# Altium footprint library con-samtec.PCBLIB: 805 footprints (part 33 of 55)
Each footprint in its own frame and in the unit in brackets; x right, y up, seen from the top. Pads: shape width x height; smd on the part's side, far side on the other; paste and mask are expansions set on the pad; w line width, h text height; cw(c..) or ccw(c..) is an arc to the next point about the centre after c.
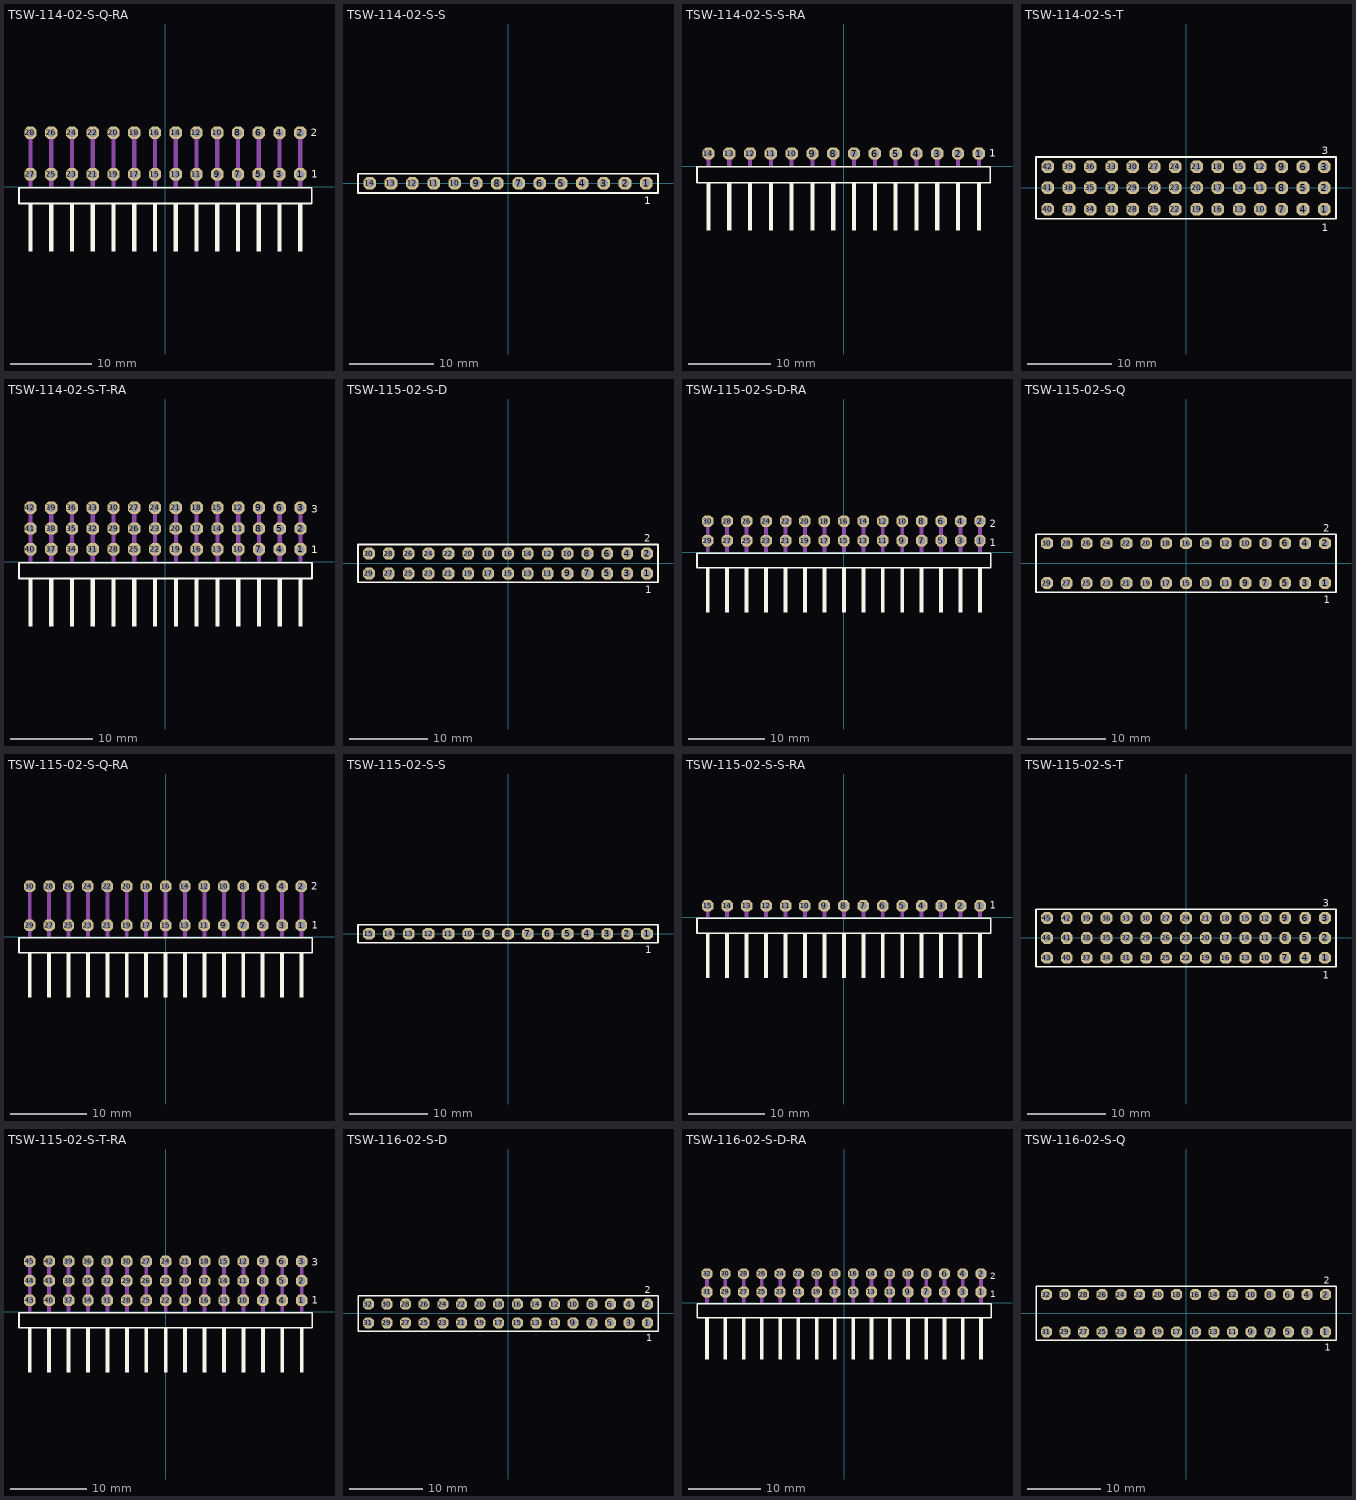
[diagram p32: the footprints below, top view; thin cyan lines are the x and y axes]

## TSW-114-02-S-Q-RA [mil]
pads (28):
  oct 59.06x59.06 hole 39.37: 1(650,60) 2(650,260) 3(550,60) 4(550,260) 5(450,60) 6(450,260) 7(350,60) 8(350,260) 9(250,60) 10(250,260) 11(150,60) 12(150,260) 13(50,60) 14(50,260) 15(-50,60) 16(-50,260) 17(-150,60) 18(-150,260) 19(-250,60) 20(-250,260) 21(-350,60) 22(-350,260) 23(-450,60) 24(-450,260) 25(-550,60) 26(-550,260) 27(-650,60) 28(-650,260)
Top Overlay:
  rectangle: -660,-310.63 -640,-80.32
  rectangle: -560,-310.63 -540,-80.32
  rectangle: -460,-310.63 -440,-80.32
  rectangle: -360,-310.63 -340,-80.32
  rectangle: -260,-310.63 -240,-80.32
  rectangle: -160,-310.63 -140,-80.32
  rectangle: -60,-310.63 -40,-80.32
  rectangle: 40,-310.63 60,-80.32
  rectangle: 140,-310.63 160,-80.32
  rectangle: 240,-310.63 260,-80.32
  rectangle: 340,-310.63 360,-80.32
  rectangle: 440,-310.63 460,-80.32
  rectangle: 540,-310.63 560,-80.32
  rectangle: 640,-310.63 660,-80.32
  lines w8: -705.08,-80.55 705.08,-80.55 705.08,-4.17 -705.08,-4.17 -705.08,-80.55
  text "1" at 703.54,43.31 h36.81
  text "2" at 701.18,242.72 h36.81
Mechanical 16:
  rectangle: -660,0 -640,270
  rectangle: -560,0 -540,270
  rectangle: -460,0 -440,270
  rectangle: -360,0 -340,270
  rectangle: -260,0 -240,270
  rectangle: -160,0 -140,270
  rectangle: -60,0 -40,270
  rectangle: 40,0 60,270
  rectangle: 140,0 160,270
  rectangle: 240,0 260,270
  rectangle: 340,0 360,270
  rectangle: 440,0 460,270
  rectangle: 540,0 560,270
  rectangle: 640,0 660,270

## TSW-114-02-S-S [mm]
pads (14):
  oct 1.5x1.5 hole 1: 1(16.51,0) 2(13.97,0) 3(11.43,0) 4(8.89,0) 5(6.35,0) 6(3.81,0) 7(1.27,0) 8(-1.27,0) 9(-3.81,0) 10(-6.35,0) 11(-8.89,0) 12(-11.43,0) 13(-13.97,0) 14(-16.51,0)
Top Overlay:
  lines w0.203: -17.909,-1.155 17.909,-1.155 17.909,1.155 -17.909,1.155 -17.909,-1.155
  text "1" at 16.252,-2.498 h0.94
Mechanical 16:
  rectangle: -16.86,-0.35 -16.16,0.35
  rectangle: -14.32,-0.35 -13.62,0.35
  rectangle: -11.78,-0.35 -11.08,0.35
  rectangle: -9.24,-0.35 -8.54,0.35
  rectangle: -6.7,-0.35 -6,0.35
  rectangle: -4.16,-0.35 -3.46,0.35
  rectangle: -1.62,-0.35 -0.92,0.35
  rectangle: 0.92,-0.35 1.62,0.35
  rectangle: 3.46,-0.35 4.16,0.35
  rectangle: 6,-0.35 6.7,0.35
  rectangle: 8.54,-0.35 9.24,0.35
  rectangle: 11.08,-0.35 11.78,0.35
  rectangle: 13.62,-0.35 14.32,0.35
  rectangle: 16.16,-0.35 16.86,0.35

## TSW-114-02-S-S-RA [mil]
pads (14):
  oct 59.06x59.06 hole 39.37: 1(650,60) 2(550,60) 3(450,60) 4(350,60) 5(250,60) 6(150,60) 7(50,60) 8(-50,60) 9(-150,60) 10(-250,60) 11(-350,60) 12(-450,60) 13(-550,60) 14(-650,60)
Top Overlay:
  rectangle: -660,-310.63 -640,-80.32
  rectangle: -560,-310.63 -540,-80.32
  rectangle: -460,-310.63 -440,-80.32
  rectangle: -360,-310.63 -340,-80.32
  rectangle: -260,-310.63 -240,-80.32
  rectangle: -160,-310.63 -140,-80.32
  rectangle: -60,-310.63 -40,-80.32
  rectangle: 40,-310.63 60,-80.32
  rectangle: 140,-310.63 160,-80.32
  rectangle: 240,-310.63 260,-80.32
  rectangle: 340,-310.63 360,-80.32
  rectangle: 440,-310.63 460,-80.32
  rectangle: 540,-310.63 560,-80.32
  rectangle: 640,-310.63 660,-80.32
  lines w8: -705.08,-80.55 705.08,-80.55 705.08,-4.17 -705.08,-4.17 -705.08,-80.55
  text "1" at 700.47,45.35 h36.81
Mechanical 16:
  rectangle: -660,0 -640,70
  rectangle: -560,0 -540,70
  rectangle: -460,0 -440,70
  rectangle: -360,0 -340,70
  rectangle: -260,0 -240,70
  rectangle: -160,0 -140,70
  rectangle: -60,0 -40,70
  rectangle: 40,0 60,70
  rectangle: 140,0 160,70
  rectangle: 240,0 260,70
  rectangle: 340,0 360,70
  rectangle: 440,0 460,70
  rectangle: 540,0 560,70
  rectangle: 640,0 660,70

## TSW-114-02-S-T [mm]
pads (42):
  oct 1.5x1.5 hole 1: 1(16.51,-2.54) 2(16.51,0) 3(16.51,2.54) 4(13.97,-2.54) 5(13.97,0) 6(13.97,2.54) 7(11.43,-2.54) 8(11.43,0) 9(11.43,2.54) 10(8.89,-2.54) 11(8.89,0) 12(8.89,2.54) 13(6.35,-2.54) 14(6.35,0) 15(6.35,2.54) 16(3.81,-2.54) 17(3.81,0) 18(3.81,2.54) 19(1.27,-2.54) 20(1.27,0) 21(1.27,2.54) 22(-1.27,-2.54) 23(-1.27,0) 24(-1.27,2.54) 25(-3.81,-2.54) 26(-3.81,0) 27(-3.81,2.54) 28(-6.35,-2.54) 29(-6.35,0) 30(-6.35,2.54) 31(-8.89,-2.54) 32(-8.89,0) 33(-8.89,2.54) 34(-11.43,-2.54) 35(-11.43,0) 36(-11.43,2.54) 37(-13.97,-2.54) 38(-13.97,0) 39(-13.97,2.54) 40(-16.51,-2.54) 41(-16.51,0) 42(-16.51,2.54)
Top Overlay:
  lines w0.203: -17.909,-3.695 17.909,-3.695 17.909,3.695 -17.909,3.695 -17.909,-3.695
  text "1" at 16.202,-5.188 h0.94
  text "3" at 16.198,3.989 h0.94
Mechanical 16:
  rectangle: -16.86,-2.89 -16.16,-2.19
  rectangle: -16.86,-0.35 -16.16,0.35
  rectangle: -16.86,2.19 -16.16,2.89
  rectangle: -14.32,-2.89 -13.62,-2.19
  rectangle: -14.32,-0.35 -13.62,0.35
  rectangle: -14.32,2.19 -13.62,2.89
  rectangle: -11.78,-2.89 -11.08,-2.19
  rectangle: -11.78,-0.35 -11.08,0.35
  rectangle: -11.78,2.19 -11.08,2.89
  rectangle: -9.24,-2.89 -8.54,-2.19
  rectangle: -9.24,-0.35 -8.54,0.35
  rectangle: -9.24,2.19 -8.54,2.89
  rectangle: -6.7,-2.89 -6,-2.19
  rectangle: -6.7,-0.35 -6,0.35
  rectangle: -6.7,2.19 -6,2.89
  rectangle: -4.16,-2.89 -3.46,-2.19
  rectangle: -4.16,-0.35 -3.46,0.35
  rectangle: -4.16,2.19 -3.46,2.89
  rectangle: -1.62,-2.89 -0.92,-2.19
  rectangle: -1.62,-0.35 -0.92,0.35
  rectangle: -1.62,2.19 -0.92,2.89
  rectangle: 0.92,-2.89 1.62,-2.19
  rectangle: 0.92,-0.35 1.62,0.35
  rectangle: 0.92,2.19 1.62,2.89
  rectangle: 3.46,-2.89 4.16,-2.19
  rectangle: 3.46,-0.35 4.16,0.35
  rectangle: 3.46,2.19 4.16,2.89
  rectangle: 6,-2.89 6.7,-2.19
  rectangle: 6,-0.35 6.7,0.35
  rectangle: 6,2.19 6.7,2.89
  rectangle: 8.54,-2.89 9.24,-2.19
  rectangle: 8.54,-0.35 9.24,0.35
  rectangle: 8.54,2.19 9.24,2.89
  rectangle: 11.08,-2.89 11.78,-2.19
  rectangle: 11.08,-0.35 11.78,0.35
  rectangle: 11.08,2.19 11.78,2.89
  rectangle: 13.62,-2.89 14.32,-2.19
  rectangle: 13.62,-0.35 14.32,0.35
  rectangle: 13.62,2.19 14.32,2.89
  rectangle: 16.16,-2.89 16.86,-2.19
  rectangle: 16.16,-0.35 16.86,0.35
  rectangle: 16.16,2.19 16.86,2.89

## TSW-114-02-S-T-RA [mil]
pads (42):
  oct 59.06x59.06 hole 39.37: 1(650,60) 2(650,160) 3(650,260) 4(550,60) 5(550,160) 6(550,260) 7(450,60) 8(450,160) 9(450,260) 10(350,60) 11(350,160) 12(350,260) 13(250,60) 14(250,160) 15(250,260) 16(150,60) 17(150,160) 18(150,260) 19(50,60) 20(50,160) 21(50,260) 22(-50,60) 23(-50,160) 24(-50,260) 25(-150,60) 26(-150,160) 27(-150,260) 28(-250,60) 29(-250,160) 30(-250,260) 31(-350,60) 32(-350,160) 33(-350,260) 34(-450,60) 35(-450,160) 36(-450,260) 37(-550,60) 38(-550,160) 39(-550,260) 40(-650,60) 41(-650,160) 42(-650,260)
Top Overlay:
  rectangle: -660,-310.63 -640,-80.32
  rectangle: -560,-310.63 -540,-80.32
  rectangle: -460,-310.63 -440,-80.32
  rectangle: -360,-310.63 -340,-80.32
  rectangle: -260,-310.63 -240,-80.32
  rectangle: -160,-310.63 -140,-80.32
  rectangle: -60,-310.63 -40,-80.32
  rectangle: 40,-310.63 60,-80.32
  rectangle: 140,-310.63 160,-80.32
  rectangle: 240,-310.63 260,-80.32
  rectangle: 340,-310.63 360,-80.32
  rectangle: 440,-310.63 460,-80.32
  rectangle: 540,-310.63 560,-80.32
  rectangle: 640,-310.63 660,-80.32
  lines w8: -705.08,-80.55 705.08,-80.55 705.08,-4.17 -705.08,-4.17 -705.08,-80.55
  text "1" at 701.57,41.34 h36.81
  text "3" at 702.17,236.81 h36.81
Mechanical 16:
  rectangle: -660,0 -640,270
  rectangle: -560,0 -540,270
  rectangle: -460,0 -440,270
  rectangle: -360,0 -340,270
  rectangle: -260,0 -240,270
  rectangle: -160,0 -140,270
  rectangle: -60,0 -40,270
  rectangle: 40,0 60,270
  rectangle: 140,0 160,270
  rectangle: 240,0 260,270
  rectangle: 340,0 360,270
  rectangle: 440,0 460,270
  rectangle: 540,0 560,270
  rectangle: 640,0 660,270

## TSW-115-02-S-D [mm]
pads (30):
  oct 1.5x1.5 hole 1: 1(17.78,-1.27) 2(17.78,1.27) 3(15.24,-1.27) 4(15.24,1.27) 5(12.7,-1.27) 6(12.7,1.27) 7(10.16,-1.27) 8(10.16,1.27) 9(7.62,-1.27) 10(7.62,1.27) 11(5.08,-1.27) 12(5.08,1.27) 13(2.54,-1.27) 14(2.54,1.27) 15(0,-1.27) 16(0,1.27) 17(-2.54,-1.27) 18(-2.54,1.27) 19(-5.08,-1.27) 20(-5.08,1.27) 21(-7.62,-1.27) 22(-7.62,1.27) 23(-10.16,-1.27) 24(-10.16,1.27) 25(-12.7,-1.27) 26(-12.7,1.27) 27(-15.24,-1.27) 28(-15.24,1.27) 29(-17.78,-1.27) 30(-17.78,1.27)
Top Overlay:
  lines w0.203: -19.179,-2.425 19.179,-2.425 19.179,2.425 -19.179,2.425 -19.179,-2.425
  text "1" at 17.572,-3.818 h0.94
  text "2" at 17.397,2.744 h0.94
Mechanical 16:
  rectangle: -18.13,-1.62 -17.43,-0.92
  rectangle: -18.13,0.92 -17.43,1.62
  rectangle: -15.59,-1.62 -14.89,-0.92
  rectangle: -15.59,0.92 -14.89,1.62
  rectangle: -13.05,-1.62 -12.35,-0.92
  rectangle: -13.05,0.92 -12.35,1.62
  rectangle: -10.51,-1.62 -9.81,-0.92
  rectangle: -10.51,0.92 -9.81,1.62
  rectangle: -7.97,-1.62 -7.27,-0.92
  rectangle: -7.97,0.92 -7.27,1.62
  rectangle: -5.43,-1.62 -4.73,-0.92
  rectangle: -5.43,0.92 -4.73,1.62
  rectangle: -2.89,-1.62 -2.19,-0.92
  rectangle: -2.89,0.92 -2.19,1.62
  rectangle: -0.35,-1.62 0.35,-0.92
  rectangle: -0.35,0.92 0.35,1.62
  rectangle: 2.19,-1.62 2.89,-0.92
  rectangle: 2.19,0.92 2.89,1.62
  rectangle: 4.73,-1.62 5.43,-0.92
  rectangle: 4.73,0.92 5.43,1.62
  rectangle: 7.27,-1.62 7.97,-0.92
  rectangle: 7.27,0.92 7.97,1.62
  rectangle: 9.81,-1.62 10.51,-0.92
  rectangle: 9.81,0.92 10.51,1.62
  rectangle: 12.35,-1.62 13.05,-0.92
  rectangle: 12.35,0.92 13.05,1.62
  rectangle: 14.89,-1.62 15.59,-0.92
  rectangle: 14.89,0.92 15.59,1.62
  rectangle: 17.43,-1.62 18.13,-0.92
  rectangle: 17.43,0.92 18.13,1.62

## TSW-115-02-S-D-RA [mil]
pads (30):
  oct 59.06x59.06 hole 39.37: 1(700,60) 2(700,160) 3(600,60) 4(600,160) 5(500,60) 6(500,160) 7(400,60) 8(400,160) 9(300,60) 10(300,160) 11(200,60) 12(200,160) 13(100,60) 14(100,160) 15(0,60) 16(0,160) 17(-100,60) 18(-100,160) 19(-200,60) 20(-200,160) 21(-300,60) 22(-300,160) 23(-400,60) 24(-400,160) 25(-500,60) 26(-500,160) 27(-600,60) 28(-600,160) 29(-700,60) 30(-700,160)
Top Overlay:
  rectangle: -710,-310.63 -690,-80.32
  rectangle: -610,-310.63 -590,-80.32
  rectangle: -510,-310.63 -490,-80.32
  rectangle: -410,-310.63 -390,-80.32
  rectangle: -310,-310.63 -290,-80.32
  rectangle: -210,-310.63 -190,-80.32
  rectangle: -110,-310.63 -90,-80.32
  rectangle: -10,-310.63 10,-80.32
  rectangle: 90,-310.63 110,-80.32
  rectangle: 190,-310.63 210,-80.32
  rectangle: 290,-310.63 310,-80.32
  rectangle: 390,-310.63 410,-80.32
  rectangle: 490,-310.63 510,-80.32
  rectangle: 590,-310.63 610,-80.32
  rectangle: 690,-310.63 710,-80.32
  lines w8: -755.08,-80.55 755.08,-80.55 755.08,-4.17 -755.08,-4.17 -755.08,-80.55
  text "1" at 750.59,30.51 h36.81
  text "2" at 749.21,129.53 h36.81
Mechanical 16:
  rectangle: -710,0 -690,170
  rectangle: -610,0 -590,170
  rectangle: -510,0 -490,170
  rectangle: -410,0 -390,170
  rectangle: -310,0 -290,170
  rectangle: -210,0 -190,170
  rectangle: -110,0 -90,170
  rectangle: -10,0 10,170
  rectangle: 90,0 110,170
  rectangle: 190,0 210,170
  rectangle: 290,0 310,170
  rectangle: 390,0 410,170
  rectangle: 490,0 510,170
  rectangle: 590,0 610,170
  rectangle: 690,0 710,170

## TSW-115-02-S-Q [mm]
pads (30):
  oct 1.5x1.5 hole 1: 1(17.78,-2.54) 2(17.78,2.54) 3(15.24,-2.54) 4(15.24,2.54) 5(12.7,-2.54) 6(12.7,2.54) 7(10.16,-2.54) 8(10.16,2.54) 9(7.62,-2.54) 10(7.62,2.54) 11(5.08,-2.54) 12(5.08,2.54) 13(2.54,-2.54) 14(2.54,2.54) 15(0,-2.54) 16(0,2.54) 17(-2.54,-2.54) 18(-2.54,2.54) 19(-5.08,-2.54) 20(-5.08,2.54) 21(-7.62,-2.54) 22(-7.62,2.54) 23(-10.16,-2.54) 24(-10.16,2.54) 25(-12.7,-2.54) 26(-12.7,2.54) 27(-15.24,-2.54) 28(-15.24,2.54) 29(-17.78,-2.54) 30(-17.78,2.54)
Top Overlay:
  lines w0.203: -19.179,-3.695 19.179,-3.695 19.179,3.695 -19.179,3.695 -19.179,-3.695
  text "1" at 17.622,-5.138 h0.94
  text "2" at 17.522,3.989 h0.94
Mechanical 16:
  rectangle: -18.13,-2.89 -17.43,-2.19
  rectangle: -18.13,2.19 -17.43,2.89
  rectangle: -15.59,-2.89 -14.89,-2.19
  rectangle: -15.59,2.19 -14.89,2.89
  rectangle: -13.05,-2.89 -12.35,-2.19
  rectangle: -13.05,2.19 -12.35,2.89
  rectangle: -10.51,-2.89 -9.81,-2.19
  rectangle: -10.51,2.19 -9.81,2.89
  rectangle: -7.97,-2.89 -7.27,-2.19
  rectangle: -7.97,2.19 -7.27,2.89
  rectangle: -5.43,-2.89 -4.73,-2.19
  rectangle: -5.43,2.19 -4.73,2.89
  rectangle: -2.89,-2.89 -2.19,-2.19
  rectangle: -2.89,2.19 -2.19,2.89
  rectangle: -0.35,-2.89 0.35,-2.19
  rectangle: -0.35,2.19 0.35,2.89
  rectangle: 2.19,-2.89 2.89,-2.19
  rectangle: 2.19,2.19 2.89,2.89
  rectangle: 4.73,-2.89 5.43,-2.19
  rectangle: 4.73,2.19 5.43,2.89
  rectangle: 7.27,-2.89 7.97,-2.19
  rectangle: 7.27,2.19 7.97,2.89
  rectangle: 9.81,-2.89 10.51,-2.19
  rectangle: 9.81,2.19 10.51,2.89
  rectangle: 12.35,-2.89 13.05,-2.19
  rectangle: 12.35,2.19 13.05,2.89
  rectangle: 14.89,-2.89 15.59,-2.19
  rectangle: 14.89,2.19 15.59,2.89
  rectangle: 17.43,-2.89 18.13,-2.19
  rectangle: 17.43,2.19 18.13,2.89

## TSW-115-02-S-Q-RA [mil]
pads (30):
  oct 59.06x59.06 hole 39.37: 1(700,60) 2(700,260) 3(600,60) 4(600,260) 5(500,60) 6(500,260) 7(400,60) 8(400,260) 9(300,60) 10(300,260) 11(200,60) 12(200,260) 13(100,60) 14(100,260) 15(0,60) 16(0,260) 17(-100,60) 18(-100,260) 19(-200,60) 20(-200,260) 21(-300,60) 22(-300,260) 23(-400,60) 24(-400,260) 25(-500,60) 26(-500,260) 27(-600,60) 28(-600,260) 29(-700,60) 30(-700,260)
Top Overlay:
  rectangle: -710,-310.63 -690,-80.32
  rectangle: -610,-310.63 -590,-80.32
  rectangle: -510,-310.63 -490,-80.32
  rectangle: -410,-310.63 -390,-80.32
  rectangle: -310,-310.63 -290,-80.32
  rectangle: -210,-310.63 -190,-80.32
  rectangle: -110,-310.63 -90,-80.32
  rectangle: -10,-310.63 10,-80.32
  rectangle: 90,-310.63 110,-80.32
  rectangle: 190,-310.63 210,-80.32
  rectangle: 290,-310.63 310,-80.32
  rectangle: 390,-310.63 410,-80.32
  rectangle: 490,-310.63 510,-80.32
  rectangle: 590,-310.63 610,-80.32
  rectangle: 690,-310.63 710,-80.32
  lines w8: -755.08,-80.55 755.08,-80.55 755.08,-4.17 -755.08,-4.17 -755.08,-80.55
  text "1" at 753.54,43.31 h36.81
  text "2" at 751.18,242.72 h36.81
Mechanical 16:
  rectangle: -710,0 -690,270
  rectangle: -610,0 -590,270
  rectangle: -510,0 -490,270
  rectangle: -410,0 -390,270
  rectangle: -310,0 -290,270
  rectangle: -210,0 -190,270
  rectangle: -110,0 -90,270
  rectangle: -10,0 10,270
  rectangle: 90,0 110,270
  rectangle: 190,0 210,270
  rectangle: 290,0 310,270
  rectangle: 390,0 410,270
  rectangle: 490,0 510,270
  rectangle: 590,0 610,270
  rectangle: 690,0 710,270

## TSW-115-02-S-S [mm]
pads (15):
  oct 1.5x1.5 hole 1: 1(17.78,0) 2(15.24,0) 3(12.7,0) 4(10.16,0) 5(7.62,0) 6(5.08,0) 7(2.54,0) 8(0,0) 9(-2.54,0) 10(-5.08,0) 11(-7.62,0) 12(-10.16,0) 13(-12.7,0) 14(-15.24,0) 15(-17.78,0)
Top Overlay:
  lines w0.203: -19.179,-1.155 19.179,-1.155 19.179,1.155 -19.179,1.155 -19.179,-1.155
  text "1" at 17.522,-2.498 h0.94
Mechanical 16:
  rectangle: -18.13,-0.35 -17.43,0.35
  rectangle: -15.59,-0.35 -14.89,0.35
  rectangle: -13.05,-0.35 -12.35,0.35
  rectangle: -10.51,-0.35 -9.81,0.35
  rectangle: -7.97,-0.35 -7.27,0.35
  rectangle: -5.43,-0.35 -4.73,0.35
  rectangle: -2.89,-0.35 -2.19,0.35
  rectangle: -0.35,-0.35 0.35,0.35
  rectangle: 2.19,-0.35 2.89,0.35
  rectangle: 4.73,-0.35 5.43,0.35
  rectangle: 7.27,-0.35 7.97,0.35
  rectangle: 9.81,-0.35 10.51,0.35
  rectangle: 12.35,-0.35 13.05,0.35
  rectangle: 14.89,-0.35 15.59,0.35
  rectangle: 17.43,-0.35 18.13,0.35

## TSW-115-02-S-S-RA [mil]
pads (15):
  oct 59.06x59.06 hole 39.37: 1(700,60) 2(600,60) 3(500,60) 4(400,60) 5(300,60) 6(200,60) 7(100,60) 8(0,60) 9(-100,60) 10(-200,60) 11(-300,60) 12(-400,60) 13(-500,60) 14(-600,60) 15(-700,60)
Top Overlay:
  rectangle: -710,-310.63 -690,-80.32
  rectangle: -610,-310.63 -590,-80.32
  rectangle: -510,-310.63 -490,-80.32
  rectangle: -410,-310.63 -390,-80.32
  rectangle: -310,-310.63 -290,-80.32
  rectangle: -210,-310.63 -190,-80.32
  rectangle: -110,-310.63 -90,-80.32
  rectangle: -10,-310.63 10,-80.32
  rectangle: 90,-310.63 110,-80.32
  rectangle: 190,-310.63 210,-80.32
  rectangle: 290,-310.63 310,-80.32
  rectangle: 390,-310.63 410,-80.32
  rectangle: 490,-310.63 510,-80.32
  rectangle: 590,-310.63 610,-80.32
  rectangle: 690,-310.63 710,-80.32
  lines w8: -755.08,-80.55 755.08,-80.55 755.08,-4.17 -755.08,-4.17 -755.08,-80.55
  text "1" at 750.47,45.35 h36.81
Mechanical 16:
  rectangle: -710,0 -690,70
  rectangle: -610,0 -590,70
  rectangle: -510,0 -490,70
  rectangle: -410,0 -390,70
  rectangle: -310,0 -290,70
  rectangle: -210,0 -190,70
  rectangle: -110,0 -90,70
  rectangle: -10,0 10,70
  rectangle: 90,0 110,70
  rectangle: 190,0 210,70
  rectangle: 290,0 310,70
  rectangle: 390,0 410,70
  rectangle: 490,0 510,70
  rectangle: 590,0 610,70
  rectangle: 690,0 710,70

## TSW-115-02-S-T [mm]
pads (45):
  oct 1.5x1.5 hole 1: 1(17.78,-2.54) 2(17.78,0) 3(17.78,2.54) 4(15.24,-2.54) 5(15.24,0) 6(15.24,2.54) 7(12.7,-2.54) 8(12.7,0) 9(12.7,2.54) 10(10.16,-2.54) 11(10.16,0) 12(10.16,2.54) 13(7.62,-2.54) 14(7.62,0) 15(7.62,2.54) 16(5.08,-2.54) 17(5.08,0) 18(5.08,2.54) 19(2.54,-2.54) 20(2.54,0) 21(2.54,2.54) 22(0,-2.54) 23(0,0) 24(0,2.54) 25(-2.54,-2.54) 26(-2.54,0) 27(-2.54,2.54) 28(-5.08,-2.54) 29(-5.08,0) 30(-5.08,2.54) 31(-7.62,-2.54) 32(-7.62,0) 33(-7.62,2.54) 34(-10.16,-2.54) 35(-10.16,0) 36(-10.16,2.54) 37(-12.7,-2.54) 38(-12.7,0) 39(-12.7,2.54) 40(-15.24,-2.54) 41(-15.24,0) 42(-15.24,2.54) 43(-17.78,-2.54) 44(-17.78,0) 45(-17.78,2.54)
Top Overlay:
  lines w0.203: -19.179,-3.695 19.179,-3.695 19.179,3.695 -19.179,3.695 -19.179,-3.695
  text "1" at 17.472,-5.188 h0.94
  text "3" at 17.468,3.989 h0.94
Mechanical 16:
  rectangle: -18.13,-2.89 -17.43,-2.19
  rectangle: -18.13,-0.35 -17.43,0.35
  rectangle: -18.13,2.19 -17.43,2.89
  rectangle: -15.59,-2.89 -14.89,-2.19
  rectangle: -15.59,-0.35 -14.89,0.35
  rectangle: -15.59,2.19 -14.89,2.89
  rectangle: -13.05,-2.89 -12.35,-2.19
  rectangle: -13.05,-0.35 -12.35,0.35
  rectangle: -13.05,2.19 -12.35,2.89
  rectangle: -10.51,-2.89 -9.81,-2.19
  rectangle: -10.51,-0.35 -9.81,0.35
  rectangle: -10.51,2.19 -9.81,2.89
  rectangle: -7.97,-2.89 -7.27,-2.19
  rectangle: -7.97,-0.35 -7.27,0.35
  rectangle: -7.97,2.19 -7.27,2.89
  rectangle: -5.43,-2.89 -4.73,-2.19
  rectangle: -5.43,-0.35 -4.73,0.35
  rectangle: -5.43,2.19 -4.73,2.89
  rectangle: -2.89,-2.89 -2.19,-2.19
  rectangle: -2.89,-0.35 -2.19,0.35
  rectangle: -2.89,2.19 -2.19,2.89
  rectangle: -0.35,-2.89 0.35,-2.19
  rectangle: -0.35,-0.35 0.35,0.35
  rectangle: -0.35,2.19 0.35,2.89
  rectangle: 2.19,-2.89 2.89,-2.19
  rectangle: 2.19,-0.35 2.89,0.35
  rectangle: 2.19,2.19 2.89,2.89
  rectangle: 4.73,-2.89 5.43,-2.19
  rectangle: 4.73,-0.35 5.43,0.35
  rectangle: 4.73,2.19 5.43,2.89
  rectangle: 7.27,-2.89 7.97,-2.19
  rectangle: 7.27,-0.35 7.97,0.35
  rectangle: 7.27,2.19 7.97,2.89
  rectangle: 9.81,-2.89 10.51,-2.19
  rectangle: 9.81,-0.35 10.51,0.35
  rectangle: 9.81,2.19 10.51,2.89
  rectangle: 12.35,-2.89 13.05,-2.19
  rectangle: 12.35,-0.35 13.05,0.35
  rectangle: 12.35,2.19 13.05,2.89
  rectangle: 14.89,-2.89 15.59,-2.19
  rectangle: 14.89,-0.35 15.59,0.35
  rectangle: 14.89,2.19 15.59,2.89
  rectangle: 17.43,-2.89 18.13,-2.19
  rectangle: 17.43,-0.35 18.13,0.35
  rectangle: 17.43,2.19 18.13,2.89

## TSW-115-02-S-T-RA [mil]
pads (45):
  oct 59.06x59.06 hole 39.37: 1(700,60) 2(700,160) 3(700,260) 4(600,60) 5(600,160) 6(600,260) 7(500,60) 8(500,160) 9(500,260) 10(400,60) 11(400,160) 12(400,260) 13(300,60) 14(300,160) 15(300,260) 16(200,60) 17(200,160) 18(200,260) 19(100,60) 20(100,160) 21(100,260) 22(0,60) 23(0,160) 24(0,260) 25(-100,60) 26(-100,160) 27(-100,260) 28(-200,60) 29(-200,160) 30(-200,260) 31(-300,60) 32(-300,160) 33(-300,260) 34(-400,60) 35(-400,160) 36(-400,260) 37(-500,60) 38(-500,160) 39(-500,260) 40(-600,60) 41(-600,160) 42(-600,260) 43(-700,60) 44(-700,160) 45(-700,260)
Top Overlay:
  rectangle: -710,-310.63 -690,-80.32
  rectangle: -610,-310.63 -590,-80.32
  rectangle: -510,-310.63 -490,-80.32
  rectangle: -410,-310.63 -390,-80.32
  rectangle: -310,-310.63 -290,-80.32
  rectangle: -210,-310.63 -190,-80.32
  rectangle: -110,-310.63 -90,-80.32
  rectangle: -10,-310.63 10,-80.32
  rectangle: 90,-310.63 110,-80.32
  rectangle: 190,-310.63 210,-80.32
  rectangle: 290,-310.63 310,-80.32
  rectangle: 390,-310.63 410,-80.32
  rectangle: 490,-310.63 510,-80.32
  rectangle: 590,-310.63 610,-80.32
  rectangle: 690,-310.63 710,-80.32
  lines w8: -755.08,-80.55 755.08,-80.55 755.08,-4.17 -755.08,-4.17 -755.08,-80.55
  text "1" at 751.57,41.34 h36.81
  text "3" at 752.17,236.81 h36.81
Mechanical 16:
  rectangle: -710,0 -690,270
  rectangle: -610,0 -590,270
  rectangle: -510,0 -490,270
  rectangle: -410,0 -390,270
  rectangle: -310,0 -290,270
  rectangle: -210,0 -190,270
  rectangle: -110,0 -90,270
  rectangle: -10,0 10,270
  rectangle: 90,0 110,270
  rectangle: 190,0 210,270
  rectangle: 290,0 310,270
  rectangle: 390,0 410,270
  rectangle: 490,0 510,270
  rectangle: 590,0 610,270
  rectangle: 690,0 710,270

## TSW-116-02-S-D [mm]
pads (32):
  oct 1.5x1.5 hole 1: 1(19.05,-1.27) 2(19.05,1.27) 3(16.51,-1.27) 4(16.51,1.27) 5(13.97,-1.27) 6(13.97,1.27) 7(11.43,-1.27) 8(11.43,1.27) 9(8.89,-1.27) 10(8.89,1.27) 11(6.35,-1.27) 12(6.35,1.27) 13(3.81,-1.27) 14(3.81,1.27) 15(1.27,-1.27) 16(1.27,1.27) 17(-1.27,-1.27) 18(-1.27,1.27) 19(-3.81,-1.27) 20(-3.81,1.27) 21(-6.35,-1.27) 22(-6.35,1.27) 23(-8.89,-1.27) 24(-8.89,1.27) 25(-11.43,-1.27) 26(-11.43,1.27) 27(-13.97,-1.27) 28(-13.97,1.27) 29(-16.51,-1.27) 30(-16.51,1.27) 31(-19.05,-1.27) 32(-19.05,1.27)
Top Overlay:
  lines w0.203: -20.449,-2.425 20.449,-2.425 20.449,2.425 -20.449,2.425 -20.449,-2.425
  text "1" at 18.842,-3.818 h0.94
  text "2" at 18.667,2.744 h0.94
Mechanical 16:
  rectangle: -19.4,-1.62 -18.7,-0.92
  rectangle: -19.4,0.92 -18.7,1.62
  rectangle: -16.86,-1.62 -16.16,-0.92
  rectangle: -16.86,0.92 -16.16,1.62
  rectangle: -14.32,-1.62 -13.62,-0.92
  rectangle: -14.32,0.92 -13.62,1.62
  rectangle: -11.78,-1.62 -11.08,-0.92
  rectangle: -11.78,0.92 -11.08,1.62
  rectangle: -9.24,-1.62 -8.54,-0.92
  rectangle: -9.24,0.92 -8.54,1.62
  rectangle: -6.7,-1.62 -6,-0.92
  rectangle: -6.7,0.92 -6,1.62
  rectangle: -4.16,-1.62 -3.46,-0.92
  rectangle: -4.16,0.92 -3.46,1.62
  rectangle: -1.62,-1.62 -0.92,-0.92
  rectangle: -1.62,0.92 -0.92,1.62
  rectangle: 0.92,-1.62 1.62,-0.92
  rectangle: 0.92,0.92 1.62,1.62
  rectangle: 3.46,-1.62 4.16,-0.92
  rectangle: 3.46,0.92 4.16,1.62
  rectangle: 6,-1.62 6.7,-0.92
  rectangle: 6,0.92 6.7,1.62
  rectangle: 8.54,-1.62 9.24,-0.92
  rectangle: 8.54,0.92 9.24,1.62
  rectangle: 11.08,-1.62 11.78,-0.92
  rectangle: 11.08,0.92 11.78,1.62
  rectangle: 13.62,-1.62 14.32,-0.92
  rectangle: 13.62,0.92 14.32,1.62
  rectangle: 16.16,-1.62 16.86,-0.92
  rectangle: 16.16,0.92 16.86,1.62
  rectangle: 18.7,-1.62 19.4,-0.92
  rectangle: 18.7,0.92 19.4,1.62

## TSW-116-02-S-D-RA [mil]
pads (32):
  oct 59.06x59.06 hole 39.37: 1(750,60) 2(750,160) 3(650,60) 4(650,160) 5(550,60) 6(550,160) 7(450,60) 8(450,160) 9(350,60) 10(350,160) 11(250,60) 12(250,160) 13(150,60) 14(150,160) 15(50,60) 16(50,160) 17(-50,60) 18(-50,160) 19(-150,60) 20(-150,160) 21(-250,60) 22(-250,160) 23(-350,60) 24(-350,160) 25(-450,60) 26(-450,160) 27(-550,60) 28(-550,160) 29(-650,60) 30(-650,160) 31(-750,60) 32(-750,160)
Top Overlay:
  rectangle: -760,-310.63 -740,-80.32
  rectangle: -660,-310.63 -640,-80.32
  rectangle: -560,-310.63 -540,-80.32
  rectangle: -460,-310.63 -440,-80.32
  rectangle: -360,-310.63 -340,-80.32
  rectangle: -260,-310.63 -240,-80.32
  rectangle: -160,-310.63 -140,-80.32
  rectangle: -60,-310.63 -40,-80.32
  rectangle: 40,-310.63 60,-80.32
  rectangle: 140,-310.63 160,-80.32
  rectangle: 240,-310.63 260,-80.32
  rectangle: 340,-310.63 360,-80.32
  rectangle: 440,-310.63 460,-80.32
  rectangle: 540,-310.63 560,-80.32
  rectangle: 640,-310.63 660,-80.32
  rectangle: 740,-310.63 760,-80.32
  lines w8: -805.08,-80.55 805.08,-80.55 805.08,-4.17 -805.08,-4.17 -805.08,-80.55
  text "1" at 800.59,30.51 h36.81
  text "2" at 799.21,129.53 h36.81
Mechanical 16:
  rectangle: -760,0 -740,170
  rectangle: -660,0 -640,170
  rectangle: -560,0 -540,170
  rectangle: -460,0 -440,170
  rectangle: -360,0 -340,170
  rectangle: -260,0 -240,170
  rectangle: -160,0 -140,170
  rectangle: -60,0 -40,170
  rectangle: 40,0 60,170
  rectangle: 140,0 160,170
  rectangle: 240,0 260,170
  rectangle: 340,0 360,170
  rectangle: 440,0 460,170
  rectangle: 540,0 560,170
  rectangle: 640,0 660,170
  rectangle: 740,0 760,170

## TSW-116-02-S-Q [mm]
pads (32):
  oct 1.5x1.5 hole 1: 1(19.05,-2.54) 2(19.05,2.54) 3(16.51,-2.54) 4(16.51,2.54) 5(13.97,-2.54) 6(13.97,2.54) 7(11.43,-2.54) 8(11.43,2.54) 9(8.89,-2.54) 10(8.89,2.54) 11(6.35,-2.54) 12(6.35,2.54) 13(3.81,-2.54) 14(3.81,2.54) 15(1.27,-2.54) 16(1.27,2.54) 17(-1.27,-2.54) 18(-1.27,2.54) 19(-3.81,-2.54) 20(-3.81,2.54) 21(-6.35,-2.54) 22(-6.35,2.54) 23(-8.89,-2.54) 24(-8.89,2.54) 25(-11.43,-2.54) 26(-11.43,2.54) 27(-13.97,-2.54) 28(-13.97,2.54) 29(-16.51,-2.54) 30(-16.51,2.54) 31(-19.05,-2.54) 32(-19.05,2.54)
Top Overlay:
  lines w0.203: -20.449,-3.695 20.449,-3.695 20.449,3.695 -20.449,3.695 -20.449,-3.695
  text "1" at 18.892,-5.138 h0.94
  text "2" at 18.792,3.989 h0.94
Mechanical 16:
  rectangle: -19.4,-2.89 -18.7,-2.19
  rectangle: -19.4,2.19 -18.7,2.89
  rectangle: -16.86,-2.89 -16.16,-2.19
  rectangle: -16.86,2.19 -16.16,2.89
  rectangle: -14.32,-2.89 -13.62,-2.19
  rectangle: -14.32,2.19 -13.62,2.89
  rectangle: -11.78,-2.89 -11.08,-2.19
  rectangle: -11.78,2.19 -11.08,2.89
  rectangle: -9.24,-2.89 -8.54,-2.19
  rectangle: -9.24,2.19 -8.54,2.89
  rectangle: -6.7,-2.89 -6,-2.19
  rectangle: -6.7,2.19 -6,2.89
  rectangle: -4.16,-2.89 -3.46,-2.19
  rectangle: -4.16,2.19 -3.46,2.89
  rectangle: -1.62,-2.89 -0.92,-2.19
  rectangle: -1.62,2.19 -0.92,2.89
  rectangle: 0.92,-2.89 1.62,-2.19
  rectangle: 0.92,2.19 1.62,2.89
  rectangle: 3.46,-2.89 4.16,-2.19
  rectangle: 3.46,2.19 4.16,2.89
  rectangle: 6,-2.89 6.7,-2.19
  rectangle: 6,2.19 6.7,2.89
  rectangle: 8.54,-2.89 9.24,-2.19
  rectangle: 8.54,2.19 9.24,2.89
  rectangle: 11.08,-2.89 11.78,-2.19
  rectangle: 11.08,2.19 11.78,2.89
  rectangle: 13.62,-2.89 14.32,-2.19
  rectangle: 13.62,2.19 14.32,2.89
  rectangle: 16.16,-2.89 16.86,-2.19
  rectangle: 16.16,2.19 16.86,2.89
  rectangle: 18.7,-2.89 19.4,-2.19
  rectangle: 18.7,2.19 19.4,2.89